# Altium schematic symbol library jlcpcb_2025_04_capacitors_extended_1210.schlib: 709 symbols (part 3 of 4) (continued)
## FV32X223K102EEG
designator C?  Capacitance: 22nF  (hidden comment: *)
Capacitor, Ceramic (MLCC), 22nF, ±10%, 1kV, X7R, ±10%, SMD 1210; Manufacturer: PSA(Prosperity Dielectrics); Manufacturer Part Number: FV32X223K102EEG; Package Size: 1210; JLCPCB Basic Part: No; JLCPCB Part Number: C692288; Supplier 1: LCSC; Category: Capacitors - MLCC; Supplier Part Number 1: C692288; Tolerance: ±10%; Voltage Rating: 1kV; Temperature Coefficient: X7R; RoHS: Yes; ComponentLink1Description: Datasheet; ComponentLink1URL: https://wmsc.lcsc.com/wmsc/upload/file/pdf/v2/lcsc/2304140030_PSA-Prosperity-Dielectrics-FV32X223K102EEG_C692288.pdf; ComponentLink2Description: JLCPCB Part URL; ComponentLink2URL: https://jlcpcb.com/partdetail/C692288; ComponentLink3Description: LCSC Part URL; ComponentLink3URL: https://lcsc.com/product-detail/Multilayer-Ceramic-Capacitors-MLCC---SMD-SMT_PSAProsperity-Dielectrics-PSAProsperity-Dielectrics-FV32X223K102EEG_C692288.html
footprint CAP-1210 (1210 (3225M) Capacitor)
pins: 1, 2

## FV32X272K202EGG
designator C?  Capacitance: 2.7nF  (hidden comment: *)
Capacitor, Ceramic (MLCC), 2.7nF, ±10%, 2kV, X7R, ±10%, SMD 1210; Manufacturer: PSA(Prosperity Dielectrics); Manufacturer Part Number: FV32X272K202EGG; Package Size: 1210; JLCPCB Basic Part: No; JLCPCB Part Number: C525360; Supplier 1: LCSC; Category: Capacitors - MLCC; Supplier Part Number 1: C525360; Tolerance: ±10%; Voltage Rating: 2kV; Temperature Coefficient: X7R; RoHS: Yes; ComponentLink1Description: Datasheet; ComponentLink1URL: https://wmsc.lcsc.com/wmsc/upload/file/pdf/v2/lcsc/2304140030_PSA-Prosperity-Dielectrics-FV32X272K202EGG_C525360.pdf; ComponentLink2Description: JLCPCB Part URL; ComponentLink2URL: https://jlcpcb.com/partdetail/C525360; ComponentLink3Description: LCSC Part URL; ComponentLink3URL: https://lcsc.com/product-detail/Multilayer-Ceramic-Capacitors-MLCC---SMD-SMT_PSAProsperity-Dielectrics-PSAProsperity-Dielectrics-FV32X272K202EGG_C525360.html
footprint CAP-1210 (1210 (3225M) Capacitor)
pins: 1, 2

## FV32X332K102ECG
designator C?  Capacitance: 3.3nF  (hidden comment: *)
Capacitor, Ceramic (MLCC), 3.3nF, 1kV, X7R, SMD 1210; Manufacturer: PSA(Prosperity Dielectrics); Manufacturer Part Number: FV32X332K102ECG; Package Size: 1210; JLCPCB Basic Part: No; JLCPCB Part Number: C2915730; Supplier 1: LCSC; Category: Capacitors - MLCC; Supplier Part Number 1: C2915730; Voltage Rating: 1kV; Temperature Coefficient: X7R; RoHS: Yes; ComponentLink1Description: Datasheet; ComponentLink1URL: https://wmsc.lcsc.com/wmsc/upload/file/pdf/v2/lcsc/2111161830_PSA-Prosperity-Dielectrics-FV32X332K102ECG_C2915730.pdf; ComponentLink2Description: JLCPCB Part URL; ComponentLink2URL: https://jlcpcb.com/partdetail/C2915730; ComponentLink3Description: LCSC Part URL; ComponentLink3URL: https://lcsc.com/product-detail/Multilayer-Ceramic-Capacitors-MLCC---SMD-SMT_PSAProsperity-Dielectrics-PSAProsperity-Dielectrics-FV32X332K102ECG_C2915730.html
footprint CAP-1210 (1210 (3225M) Capacitor)
pins: 1, 2

## FV32X332K202EGG
designator C?  Capacitance: 3.3nF  (hidden comment: *)
Capacitor, Ceramic (MLCC), 3.3nF, ±10%, 2kV, X7R, ±10%, SMD 1210; Manufacturer: PSA(Prosperity Dielectrics); Manufacturer Part Number: FV32X332K202EGG; Package Size: 1210; JLCPCB Basic Part: No; JLCPCB Part Number: C146198; Supplier 1: LCSC; Category: Capacitors - MLCC; Supplier Part Number 1: C146198; Tolerance: ±10%; Voltage Rating: 2kV; Temperature Coefficient: X7R; RoHS: Yes; ComponentLink1Description: Datasheet; ComponentLink1URL: https://wmsc.lcsc.com/wmsc/upload/file/pdf/v2/lcsc/2304140030_PSA-Prosperity-Dielectrics-FV32X332K202EGG_C146198.pdf; ComponentLink2Description: JLCPCB Part URL; ComponentLink2URL: https://jlcpcb.com/partdetail/C146198; ComponentLink3Description: LCSC Part URL; ComponentLink3URL: https://lcsc.com/product-detail/Multilayer-Ceramic-Capacitors-MLCC---SMD-SMT_PSAProsperity-Dielectrics-PSAProsperity-Dielectrics-FV32X332K202EGG_C146198.html
footprint CAP-1210 (1210 (3225M) Capacitor)
pins: 1, 2

## FV32X333K102EEG
designator C?  Capacitance: 33nF  (hidden comment: *)
Capacitor, Ceramic (MLCC), 33nF, ±10%, 1kV, ±10%, SMD 1210; Manufacturer: PSA(Prosperity Dielectrics); Manufacturer Part Number: FV32X333K102EEG; Package Size: 1210; JLCPCB Basic Part: No; JLCPCB Part Number: C1021549; Supplier 1: LCSC; Category: Capacitors - MLCC; Supplier Part Number 1: C1021549; Tolerance: ±10%; Voltage Rating: 1kV; RoHS: Yes; ComponentLink1Description: Datasheet; ComponentLink1URL: https://wmsc.lcsc.com/wmsc/upload/file/pdf/v2/lcsc/2304140030_PSA-Prosperity-Dielectrics-FV32X333K102EEG_C1021549.pdf; ComponentLink2Description: JLCPCB Part URL; ComponentLink2URL: https://jlcpcb.com/partdetail/C1021549; ComponentLink3Description: LCSC Part URL; ComponentLink3URL: https://lcsc.com/product-detail/Multilayer-Ceramic-Capacitors-MLCC---SMD-SMT_PSAProsperity-Dielectrics-PSAProsperity-Dielectrics-FV32X333K102EEG_C1021549.html
footprint CAP-1210 (1210 (3225M) Capacitor)
pins: 1, 2

## FV32X334K251EFG
designator C?  Capacitance: 330nF  (hidden comment: *)
Capacitor, Ceramic (MLCC), 330nF, ±10%, 250V, X7R, ±10%, SMD 1210; Manufacturer: PSA(Prosperity Dielectrics); Manufacturer Part Number: FV32X334K251EFG; Package Size: 1210; JLCPCB Basic Part: No; JLCPCB Part Number: C5366113; Supplier 1: LCSC; Category: Capacitors - MLCC; Supplier Part Number 1: C5366113; Tolerance: ±10%; Voltage Rating: 250V; Temperature Coefficient: X7R; RoHS: Yes; ComponentLink1Description: Datasheet; ComponentLink1URL: https://wmsc.lcsc.com/wmsc/upload/file/pdf/v2/lcsc/2302241830_PSA-Prosperity-Dielectrics-FV32X334K251EFG_C5366113.pdf; ComponentLink2Description: JLCPCB Part URL; ComponentLink2URL: https://jlcpcb.com/partdetail/C5366113; ComponentLink3Description: LCSC Part URL; ComponentLink3URL: https://lcsc.com/product-detail/Multilayer-Ceramic-Capacitors-MLCC---SMD-SMT_PSAProsperity-Dielectrics-PSAProsperity-Dielectrics-FV32X334K251EFG_C5366113.html
footprint CAP-1210 (1210 (3225M) Capacitor)
pins: 1, 2

## FV32X471K202EEG
designator C?  Capacitance: 470pF  (hidden comment: *)
Capacitor, Ceramic (MLCC), 470pF, ±10%, 2kV, X7R, ±10%, SMD 1210; Manufacturer: PSA(Prosperity Dielectrics); Manufacturer Part Number: FV32X471K202EEG; Package Size: 1210; JLCPCB Basic Part: No; JLCPCB Part Number: C146199; Supplier 1: LCSC; Category: Capacitors - MLCC; Supplier Part Number 1: C146199; Tolerance: ±10%; Voltage Rating: 2kV; Temperature Coefficient: X7R; RoHS: Yes; ComponentLink1Description: Datasheet; ComponentLink1URL: https://wmsc.lcsc.com/wmsc/upload/file/pdf/v2/lcsc/2304140030_PSA-Prosperity-Dielectrics-FV32X471K202EEG_C146199.pdf; ComponentLink2Description: JLCPCB Part URL; ComponentLink2URL: https://jlcpcb.com/partdetail/C146199; ComponentLink3Description: LCSC Part URL; ComponentLink3URL: https://lcsc.com/product-detail/Multilayer-Ceramic-Capacitors-MLCC---SMD-SMT_PSAProsperity-Dielectrics-PSAProsperity-Dielectrics-FV32X471K202EEG_C146199.html
footprint CAP-1210 (1210 (3225M) Capacitor)
pins: 1, 2

## FV32X472K202EGG
designator C?  Capacitance: 4.7nF  (hidden comment: *)
Capacitor, Ceramic (MLCC), 4.7nF, ±10%, 2kV, X7R, ±10%, SMD 1210; Manufacturer: PSA(Prosperity Dielectrics); Manufacturer Part Number: FV32X472K202EGG; Package Size: 1210; JLCPCB Basic Part: No; JLCPCB Part Number: C382199; Supplier 1: LCSC; Category: Capacitors - MLCC; Supplier Part Number 1: C382199; Tolerance: ±10%; Voltage Rating: 2kV; Temperature Coefficient: X7R; RoHS: Yes; ComponentLink1Description: Datasheet; ComponentLink1URL: https://wmsc.lcsc.com/wmsc/upload/file/pdf/v2/lcsc/2304140030_PSA-Prosperity-Dielectrics-FV32X472K202EGG_C382199.pdf; ComponentLink2Description: JLCPCB Part URL; ComponentLink2URL: https://jlcpcb.com/partdetail/C382199; ComponentLink3Description: LCSC Part URL; ComponentLink3URL: https://lcsc.com/product-detail/Multilayer-Ceramic-Capacitors-MLCC---SMD-SMT_PSAProsperity-Dielectrics-PSAProsperity-Dielectrics-FV32X472K202EGG_C382199.html
footprint CAP-1210 (1210 (3225M) Capacitor)
pins: 1, 2

## FV32X473K102EGG
designator C?  Capacitance: 47nF  (hidden comment: *)
Capacitor, Ceramic (MLCC), 47nF, ±10%, 1kV, X7R, ±10%, SMD 1210; Manufacturer: PSA(Prosperity Dielectrics); Manufacturer Part Number: FV32X473K102EGG; Package Size: 1210; JLCPCB Basic Part: No; JLCPCB Part Number: C525361; Supplier 1: LCSC; Category: Capacitors - MLCC; Supplier Part Number 1: C525361; Tolerance: ±10%; Voltage Rating: 1kV; Temperature Coefficient: X7R; RoHS: Yes; ComponentLink1Description: Datasheet; ComponentLink1URL: https://wmsc.lcsc.com/wmsc/upload/file/pdf/v2/lcsc/2304140030_PSA-Prosperity-Dielectrics-FV32X473K102EGG_C525361.pdf; ComponentLink2Description: JLCPCB Part URL; ComponentLink2URL: https://jlcpcb.com/partdetail/C525361; ComponentLink3Description: LCSC Part URL; ComponentLink3URL: https://lcsc.com/product-detail/Multilayer-Ceramic-Capacitors-MLCC---SMD-SMT_PSAProsperity-Dielectrics-PSAProsperity-Dielectrics-FV32X473K102EGG_C525361.html
footprint CAP-1210 (1210 (3225M) Capacitor)
pins: 1, 2

## GCJ32DC72A475KE01L
designator C?  Capacitance: 4.7uF  (hidden comment: *)
Capacitor, Ceramic (MLCC), 4.7uF, ±10%, 100V, X7S, ±10%, SMD 1210; Manufacturer: Murata Electronics; Manufacturer Part Number: GCJ32DC72A475KE01L; Package Size: 1210; JLCPCB Basic Part: No; JLCPCB Part Number: C437430; Supplier 1: LCSC; Category: Capacitors - MLCC; Supplier Part Number 1: C437430; Tolerance: ±10%; Voltage Rating: 100V; Temperature Coefficient: X7S; RoHS: Yes; ComponentLink1Description: Datasheet; ComponentLink1URL: https://wmsc.lcsc.com/wmsc/upload/file/pdf/v2/lcsc/2304140030_Murata-Electronics-GCJ32DC72A475KE01L_C437430.pdf; ComponentLink2Description: JLCPCB Part URL; ComponentLink2URL: https://jlcpcb.com/partdetail/C437430; ComponentLink3Description: LCSC Part URL; ComponentLink3URL: https://lcsc.com/product-detail/Multilayer-Ceramic-Capacitors-MLCC---SMD-SMT_Murata-Electronics-Murata-Electronics-GCJ32DC72A475KE01L_C437430.html
footprint CAP-1210 (1210 (3225M) Capacitor)
pins: 1, 2

## GCJ32DR72A225KA01L
designator C?  Capacitance: 2.2uF  (hidden comment: *)
Capacitor, Ceramic (MLCC), 2.2uF, ±10%, 100V, X7R, ±10%, SMD 1210; Manufacturer: Murata Electronics; Manufacturer Part Number: GCJ32DR72A225KA01L; Package Size: 1210; JLCPCB Basic Part: No; JLCPCB Part Number: C388903; Supplier 1: LCSC; Category: Capacitors - MLCC; Supplier Part Number 1: C388903; Tolerance: ±10%; Voltage Rating: 100V; Temperature Coefficient: X7R; RoHS: Yes; ComponentLink1Description: Datasheet; ComponentLink1URL: https://wmsc.lcsc.com/wmsc/upload/file/pdf/v2/lcsc/1912111437_Murata-Electronics-GCJ32DR72A225KA01L_C388903.pdf; ComponentLink2Description: JLCPCB Part URL; ComponentLink2URL: https://jlcpcb.com/partdetail/C388903; ComponentLink3Description: LCSC Part URL; ComponentLink3URL: https://lcsc.com/product-detail/Multilayer-Ceramic-Capacitors-MLCC---SMD-SMT_Murata-Electronics-Murata-Electronics-GCJ32DR72A225KA01L_C388903.html
footprint CAP-1210 (1210 (3225M) Capacitor)
pins: 1, 2

## GCJ32DR72E224KXJ1L
designator C?  Capacitance: 220nF  (hidden comment: *)
Capacitor, Ceramic (MLCC), 220nF, ±10%, 250V, X7R, ±10%, SMD 1210; Manufacturer: Murata Electronics; Manufacturer Part Number: GCJ32DR72E224KXJ1L; Package Size: 1210; JLCPCB Basic Part: No; JLCPCB Part Number: C710636; Supplier 1: LCSC; Category: Capacitors - MLCC; Supplier Part Number 1: C710636; Tolerance: ±10%; Voltage Rating: 250V; Temperature Coefficient: X7R; RoHS: Yes; ComponentLink1Description: Datasheet; ComponentLink1URL: https://wmsc.lcsc.com/wmsc/upload/file/pdf/v2/lcsc/2210190600_Murata-Electronics-GCJ32DR72E224KXJ1L_C710636.pdf; ComponentLink2Description: JLCPCB Part URL; ComponentLink2URL: https://jlcpcb.com/partdetail/C710636; ComponentLink3Description: LCSC Part URL; ComponentLink3URL: https://lcsc.com/product-detail/Multilayer-Ceramic-Capacitors-MLCC---SMD-SMT_Murata-Electronics-Murata-Electronics-GCJ32DR72E224KXJ1L_C710636.html
footprint CAP-1210 (1210 (3225M) Capacitor)
pins: 1, 2

## GCJ32EC71E226KE02L
designator C?  Capacitance: 22uF  (hidden comment: *)
Capacitor, Ceramic (MLCC), 22uF, ±10%, 25V, X7S, ±10%, SMD 1210; Manufacturer: Murata Electronics; Manufacturer Part Number: GCJ32EC71E226KE02L; Package Size: 1210; JLCPCB Basic Part: No; JLCPCB Part Number: C2987944; Supplier 1: LCSC; Category: Capacitors - MLCC; Supplier Part Number 1: C2987944; Tolerance: ±10%; Voltage Rating: 25V; Temperature Coefficient: X7S; RoHS: Yes; ComponentLink1Description: Datasheet; ComponentLink1URL: https://wmsc.lcsc.com/wmsc/upload/file/pdf/v2/lcsc/2206021745_Murata-Electronics-GCJ32EC71E226KE02L_C2987944.pdf; ComponentLink2Description: JLCPCB Part URL; ComponentLink2URL: https://jlcpcb.com/partdetail/C2987944; ComponentLink3Description: LCSC Part URL; ComponentLink3URL: https://lcsc.com/product-detail/Multilayer-Ceramic-Capacitors-MLCC---SMD-SMT_Murata-Electronics-Murata-Electronics-GCJ32EC71E226KE02L_C2987944.html
footprint CAP-1210 (1210 (3225M) Capacitor)
pins: 1, 2

## GCJ32EC71H106KA01L
designator C?  Capacitance: 10uF  (hidden comment: *)
Capacitor, Ceramic (MLCC), 10uF, ±10%, 50V, X7S, ±10%, SMD 1210; Manufacturer: Murata Electronics; Manufacturer Part Number: GCJ32EC71H106KA01L; Package Size: 1210; JLCPCB Basic Part: No; JLCPCB Part Number: C437431; Supplier 1: LCSC; Category: Capacitors - MLCC; Supplier Part Number 1: C437431; Tolerance: ±10%; Voltage Rating: 50V; Temperature Coefficient: X7S; RoHS: Yes; ComponentLink1Description: Datasheet; ComponentLink1URL: https://wmsc.lcsc.com/wmsc/upload/file/pdf/v2/lcsc/2304140030_Murata-Electronics-GCJ32EC71H106KA01L_C437431.pdf; ComponentLink2Description: JLCPCB Part URL; ComponentLink2URL: https://jlcpcb.com/partdetail/C437431; ComponentLink3Description: LCSC Part URL; ComponentLink3URL: https://lcsc.com/product-detail/Multilayer-Ceramic-Capacitors-MLCC---SMD-SMT_Murata-Electronics-Murata-Electronics-GCJ32EC71H106KA01L_C437431.html
footprint CAP-1210 (1210 (3225M) Capacitor)
pins: 1, 2

## GCJ32EL81E475KA01L
designator C?  Capacitance: 4.7uF  (hidden comment: *)
Capacitor, Ceramic (MLCC), 4.7uF, ±10%, 25V, X8L, ±10%, SMD 1210; Manufacturer: Murata Electronics; Manufacturer Part Number: GCJ32EL81E475KA01L; Package Size: 1210; JLCPCB Basic Part: No; JLCPCB Part Number: C161125; Supplier 1: LCSC; Category: Capacitors - MLCC; Supplier Part Number 1: C161125; Tolerance: ±10%; Voltage Rating: 25V; Temperature Coefficient: X8L; RoHS: Yes; ComponentLink1Description: Datasheet; ComponentLink1URL: https://wmsc.lcsc.com/wmsc/upload/file/pdf/v2/lcsc/1810250922_Murata-Electronics-GCJ32EL81E475KA01L_C161125.pdf; ComponentLink2Description: JLCPCB Part URL; ComponentLink2URL: https://jlcpcb.com/partdetail/C161125; ComponentLink3Description: LCSC Part URL; ComponentLink3URL: https://lcsc.com/product-detail/Multilayer-Ceramic-Capacitors-MLCC---SMD-SMT_Murata-Electronics-Murata-Electronics-GCJ32EL81E475KA01L_C161125.html
footprint CAP-1210 (1210 (3225M) Capacitor)
pins: 1, 2

## GCJ32ER71C226KE01L
designator C?  Capacitance: 22uF  (hidden comment: *)
Capacitor, Ceramic (MLCC), 22uF, ±10%, 16V, X7R, ±10%, SMD 1210; Manufacturer: Murata Electronics; Manufacturer Part Number: GCJ32ER71C226KE01L; Package Size: 1210; JLCPCB Basic Part: No; JLCPCB Part Number: C417134; Supplier 1: LCSC; Category: Capacitors - MLCC; Supplier Part Number 1: C417134; Tolerance: ±10%; Voltage Rating: 16V; Temperature Coefficient: X7R; RoHS: Yes; ComponentLink1Description: Datasheet; ComponentLink1URL: https://wmsc.lcsc.com/wmsc/upload/file/pdf/v2/lcsc/2201242200_Murata-Electronics-GCJ32ER71C226KE01L_C417134.pdf; ComponentLink2Description: JLCPCB Part URL; ComponentLink2URL: https://jlcpcb.com/partdetail/C417134; ComponentLink3Description: LCSC Part URL; ComponentLink3URL: https://lcsc.com/product-detail/Multilayer-Ceramic-Capacitors-MLCC---SMD-SMT_Murata-Electronics-Murata-Electronics-GCJ32ER71C226KE01L_C417134.html
footprint CAP-1210 (1210 (3225M) Capacitor)
pins: 1, 2

## GCJ32ER71H475KA12K
designator C?  Capacitance: 4.7uF  (hidden comment: *)
Capacitor, Ceramic (MLCC), 4.7uF, ±10%, 50V, X7R, ±10%, SMD 1210; Manufacturer: Murata Electronics; Manufacturer Part Number: GCJ32ER71H475KA12K; Package Size: 1210; JLCPCB Basic Part: No; JLCPCB Part Number: C2974491; Supplier 1: LCSC; Category: Capacitors - MLCC; Supplier Part Number 1: C2974491; Tolerance: ±10%; Voltage Rating: 50V; Temperature Coefficient: X7R; RoHS: Yes; ComponentLink1Description: Datasheet; ComponentLink1URL: https://wmsc.lcsc.com/wmsc/upload/file/pdf/v2/lcsc/2202111130_Murata-Electronics-GCJ32ER71H475KA12K_C2974491.pdf; ComponentLink2Description: JLCPCB Part URL; ComponentLink2URL: https://jlcpcb.com/partdetail/C2974491; ComponentLink3Description: LCSC Part URL; ComponentLink3URL: https://lcsc.com/product-detail/Multilayer-Ceramic-Capacitors-MLCC---SMD-SMT_Murata-Electronics-Murata-Electronics-GCJ32ER71H475KA12K_C2974491.html
footprint CAP-1210 (1210 (3225M) Capacitor)
pins: 1, 2

## GCJ32ER71H475KA12L
designator C?  Capacitance: 4.7uF  (hidden comment: *)
Capacitor, Ceramic (MLCC), 4.7uF, ±10%, 50V, X7R, ±10%, SMD 1210; Manufacturer: Murata Electronics; Manufacturer Part Number: GCJ32ER71H475KA12L; Package Size: 1210; JLCPCB Basic Part: No; JLCPCB Part Number: C417122; Supplier 1: LCSC; Category: Capacitors - MLCC; Supplier Part Number 1: C417122; Tolerance: ±10%; Voltage Rating: 50V; Temperature Coefficient: X7R; RoHS: Yes; ComponentLink1Description: Datasheet; ComponentLink1URL: https://wmsc.lcsc.com/wmsc/upload/file/pdf/v2/lcsc/2007231032_Murata-Electronics-GCJ32ER71H475KA12L_C417122.pdf; ComponentLink2Description: JLCPCB Part URL; ComponentLink2URL: https://jlcpcb.com/partdetail/C417122; ComponentLink3Description: LCSC Part URL; ComponentLink3URL: https://lcsc.com/product-detail/Multilayer-Ceramic-Capacitors-MLCC---SMD-SMT_Murata-Electronics-Murata-Electronics-GCJ32ER71H475KA12L_C417122.html
footprint CAP-1210 (1210 (3225M) Capacitor)
pins: 1, 2

## GCJ32ER91C106KE01L
designator C?  Capacitance: 10uF  (hidden comment: *)
Capacitor, Ceramic (MLCC), 10uF, ±10%, 16V, X8R, ±10%, SMD 1210; Manufacturer: Murata Electronics; Manufacturer Part Number: GCJ32ER91C106KE01L; Package Size: 1210; JLCPCB Basic Part: No; JLCPCB Part Number: C3832782; Supplier 1: LCSC; Category: Capacitors - MLCC; Supplier Part Number 1: C3832782; Tolerance: ±10%; Voltage Rating: 16V; Temperature Coefficient: X8R; RoHS: Yes; ComponentLink1Description: Datasheet; ComponentLink1URL: https://wmsc.lcsc.com/wmsc/upload/file/pdf/v2/lcsc/2308111425_Murata-Electronics-GCJ32ER91C106KE01L_C3832782.pdf; ComponentLink2Description: JLCPCB Part URL; ComponentLink2URL: https://jlcpcb.com/partdetail/C3832782; ComponentLink3Description: LCSC Part URL; ComponentLink3URL: https://lcsc.com/product-detail/Multilayer-Ceramic-Capacitors-MLCC---SMD-SMT_Murata-Electronics-Murata-Electronics-GCJ32ER91C106KE01L_C3832782.html
footprint CAP-1210 (1210 (3225M) Capacitor)
pins: 1, 2

## GCM32D7U2J103JX01L
designator C?  Capacitance: 10nF  (hidden comment: *)
Capacitor, Ceramic (MLCC), 10nF, ±5%, 630V, U2J, ±5%, SMD 1210; Manufacturer: Murata Electronics; Manufacturer Part Number: GCM32D7U2J103JX01L; Package Size: 1210; JLCPCB Basic Part: No; JLCPCB Part Number: C161278; Supplier 1: LCSC; Category: Capacitors - MLCC; Supplier Part Number 1: C161278; Tolerance: ±5%; Voltage Rating: 630V; Temperature Coefficient: U2J; RoHS: Yes; ComponentLink1Description: Datasheet; ComponentLink1URL: https://wmsc.lcsc.com/wmsc/upload/file/pdf/v2/lcsc/2304140030_Murata-Electronics-GCM32D7U2J103JX01L_C161278.pdf; ComponentLink2Description: JLCPCB Part URL; ComponentLink2URL: https://jlcpcb.com/partdetail/C161278; ComponentLink3Description: LCSC Part URL; ComponentLink3URL: https://lcsc.com/product-detail/Multilayer-Ceramic-Capacitors-MLCC---SMD-SMT_Murata-Electronics-Murata-Electronics-GCM32D7U2J103JX01L_C161278.html
footprint CAP-1210 (1210 (3225M) Capacitor)
pins: 1, 2

## GCM32D7U3A222JX01L
designator C?  Capacitance: 2200pF  (hidden comment: *)
Capacitor, Ceramic (MLCC), 2200pF, ±5%, 1kV, U2J, ±5%, SMD 1210; Manufacturer: Murata Electronics; Manufacturer Part Number: GCM32D7U3A222JX01L; Package Size: 1210; JLCPCB Basic Part: No; JLCPCB Part Number: C710713; Supplier 1: LCSC; Category: Capacitors - MLCC; Supplier Part Number 1: C710713; Tolerance: ±5%; Voltage Rating: 1kV; Temperature Coefficient: U2J; RoHS: Yes; ComponentLink1Description: Datasheet; ComponentLink1URL: https://wmsc.lcsc.com/wmsc/upload/file/pdf/v2/lcsc/2308111811_Murata-Electronics-GCM32D7U3A222JX01L_C710713.pdf; ComponentLink2Description: JLCPCB Part URL; ComponentLink2URL: https://jlcpcb.com/partdetail/C710713; ComponentLink3Description: LCSC Part URL; ComponentLink3URL: https://lcsc.com/product-detail/Multilayer-Ceramic-Capacitors-MLCC---SMD-SMT_Murata-Electronics-Murata-Electronics-GCM32D7U3A222JX01L_C710713.html
footprint CAP-1210 (1210 (3225M) Capacitor)
pins: 1, 2

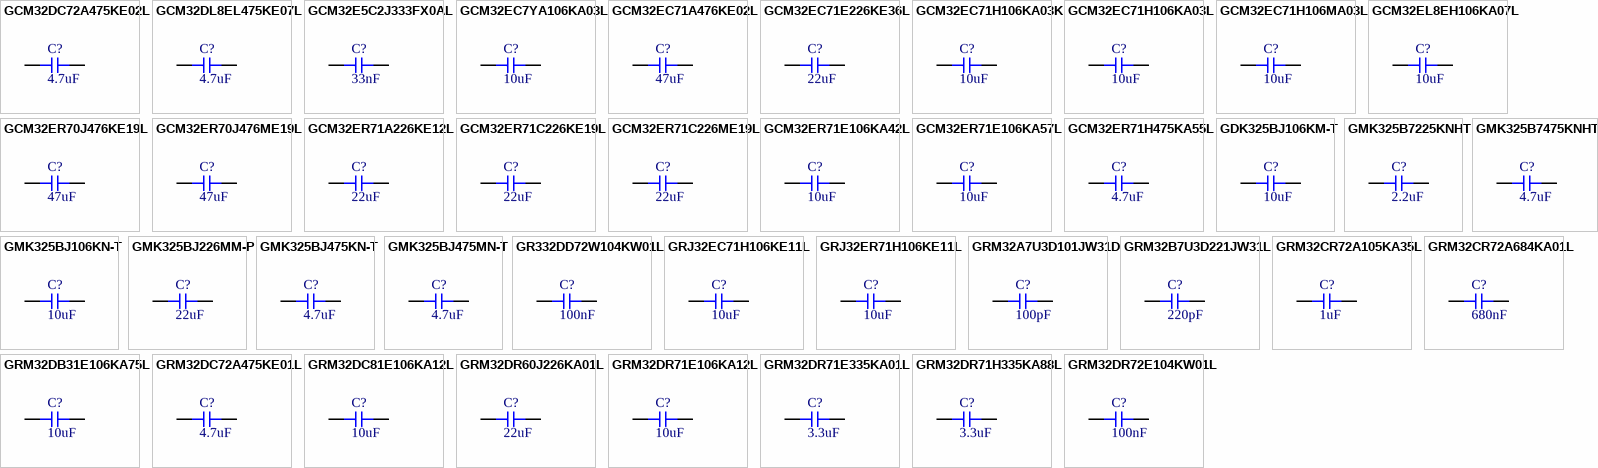
[diagram p13: symbols GCM32DC72A475KE02L to GRM32DR72E104KW01L]

## GCM32DC72A475KE02L
designator C?  Capacitance: 4.7uF  (hidden comment: *)
Capacitor, Ceramic (MLCC), 4.7uF, ±10%, 100V, ±10%, SMD 1210; Manufacturer: Murata Electronics; Manufacturer Part Number: GCM32DC72A475KE02L; Package Size: 1210; JLCPCB Basic Part: No; JLCPCB Part Number: C913445; Supplier 1: LCSC; Category: Capacitors - MLCC; Supplier Part Number 1: C913445; Tolerance: ±10%; Voltage Rating: 100V; RoHS: Yes; ComponentLink1Description: Datasheet; ComponentLink1URL: https://wmsc.lcsc.com/wmsc/upload/file/pdf/v2/lcsc/2304140030_Murata-Electronics-GCM32DC72A475KE02L_C913445.pdf; ComponentLink2Description: JLCPCB Part URL; ComponentLink2URL: https://jlcpcb.com/partdetail/C913445; ComponentLink3Description: LCSC Part URL; ComponentLink3URL: https://lcsc.com/product-detail/Multilayer-Ceramic-Capacitors-MLCC---SMD-SMT_Murata-Electronics-Murata-Electronics-GCM32DC72A475KE02L_C913445.html
footprint CAP-1210 (1210 (3225M) Capacitor)
pins: 1, 2

## GCM32DL8EL475KE07L
designator C?  Capacitance: 4.7uF  (hidden comment: *)
Capacitor, Ceramic (MLCC), 4.7uF, ±10%, 100V, ±10%, SMD 1210; Manufacturer: Murata Electronics; Manufacturer Part Number: GCM32DL8EL475KE07L; Package Size: 1210; JLCPCB Basic Part: No; JLCPCB Part Number: C883615; Supplier 1: LCSC; Category: Capacitors - MLCC; Supplier Part Number 1: C883615; Tolerance: ±10%; Voltage Rating: 100V; RoHS: Yes; ComponentLink1Description: Datasheet; ComponentLink1URL: https://wmsc.lcsc.com/wmsc/upload/file/pdf/v2/lcsc/2304140030_Murata-Electronics-GCM32DL8EL475KE07L_C883615.pdf; ComponentLink2Description: JLCPCB Part URL; ComponentLink2URL: https://jlcpcb.com/partdetail/C883615; ComponentLink3Description: LCSC Part URL; ComponentLink3URL: https://lcsc.com/product-detail/Multilayer-Ceramic-Capacitors-MLCC---SMD-SMT_Murata-Electronics-Murata-Electronics-GCM32DL8EL475KE07L_C883615.html
footprint CAP-1210 (1210 (3225M) Capacitor)
pins: 1, 2

## GCM32E5C2J333FX0AL
designator C?  Capacitance: 33nF  (hidden comment: *)
Capacitor, Ceramic (MLCC), 33nF, ±1%, 630V, C0G, ±1%, SMD 1210; Manufacturer: Murata Electronics; Manufacturer Part Number: GCM32E5C2J333FX0AL; Package Size: 1210; JLCPCB Basic Part: No; JLCPCB Part Number: C3877770; Supplier 1: LCSC; Category: Capacitors - MLCC; Supplier Part Number 1: C3877770; Tolerance: ±1%; Voltage Rating: 630V; Temperature Coefficient: C0G; RoHS: Yes; ComponentLink1Description: Datasheet; ComponentLink1URL: https://wmsc.lcsc.com/wmsc/upload/file/pdf/v2/lcsc/2308111756_Murata-Electronics-GCM32E5C2J333FX0AL_C3877770.pdf; ComponentLink2Description: JLCPCB Part URL; ComponentLink2URL: https://jlcpcb.com/partdetail/C3877770; ComponentLink3Description: LCSC Part URL; ComponentLink3URL: https://lcsc.com/product-detail/Multilayer-Ceramic-Capacitors-MLCC---SMD-SMT_Murata-Electronics-Murata-Electronics-GCM32E5C2J333FX0AL_C3877770.html
footprint CAP-1210 (1210 (3225M) Capacitor)
pins: 1, 2

## GCM32EC7YA106KA03L
designator C?  Capacitance: 10uF  (hidden comment: *)
Capacitor, Ceramic (MLCC), 10uF, ±10%, 35V, X7S, ±10%, SMD 1210; Manufacturer: Murata Electronics; Manufacturer Part Number: GCM32EC7YA106KA03L; Package Size: 1210; JLCPCB Basic Part: No; JLCPCB Part Number: C161280; Supplier 1: LCSC; Category: Capacitors - MLCC; Supplier Part Number 1: C161280; Tolerance: ±10%; Voltage Rating: 35V; Temperature Coefficient: X7S; RoHS: Yes; ComponentLink1Description: Datasheet; ComponentLink1URL: https://wmsc.lcsc.com/wmsc/upload/file/pdf/v2/lcsc/1810250922_Murata-Electronics-GCM32EC7YA106KA03L_C161280.pdf; ComponentLink2Description: JLCPCB Part URL; ComponentLink2URL: https://jlcpcb.com/partdetail/C161280; ComponentLink3Description: LCSC Part URL; ComponentLink3URL: https://lcsc.com/product-detail/Multilayer-Ceramic-Capacitors-MLCC---SMD-SMT_Murata-Electronics-Murata-Electronics-GCM32EC7YA106KA03L_C161280.html
footprint CAP-1210 (1210 (3225M) Capacitor)
pins: 1, 2

## GCM32EC71A476KE02L
designator C?  Capacitance: 47uF  (hidden comment: *)
Capacitor, Ceramic (MLCC), 47uF, ±10%, 10V, X7S, ±10%, SMD 1210; Manufacturer: Murata Electronics; Manufacturer Part Number: GCM32EC71A476KE02L; Package Size: 1210; JLCPCB Basic Part: No; JLCPCB Part Number: C3019535; Supplier 1: LCSC; Category: Capacitors - MLCC; Supplier Part Number 1: C3019535; Tolerance: ±10%; Voltage Rating: 10V; Temperature Coefficient: X7S; RoHS: Yes; ComponentLink1Description: Datasheet; ComponentLink1URL: https://wmsc.lcsc.com/wmsc/upload/file/pdf/v2/lcsc/2207261030_Murata-Electronics-GCM32EC71A476KE02L_C3019535.pdf; ComponentLink2Description: JLCPCB Part URL; ComponentLink2URL: https://jlcpcb.com/partdetail/C3019535; ComponentLink3Description: LCSC Part URL; ComponentLink3URL: https://lcsc.com/product-detail/Multilayer-Ceramic-Capacitors-MLCC---SMD-SMT_Murata-Electronics-Murata-Electronics-GCM32EC71A476KE02L_C3019535.html
footprint CAP-1210 (1210 (3225M) Capacitor)
pins: 1, 2

## GCM32EC71E226KE36L
designator C?  Capacitance: 22uF  (hidden comment: *)
Capacitor, Ceramic (MLCC), 22uF, ±10%, 25V, X7S, ±10%, SMD 1210; Manufacturer: Murata Electronics; Manufacturer Part Number: GCM32EC71E226KE36L; Package Size: 1210; JLCPCB Basic Part: No; JLCPCB Part Number: C426653; Supplier 1: LCSC; Category: Capacitors - MLCC; Supplier Part Number 1: C426653; Tolerance: ±10%; Voltage Rating: 25V; Temperature Coefficient: X7S; RoHS: Yes; ComponentLink1Description: Datasheet; ComponentLink1URL: https://wmsc.lcsc.com/wmsc/upload/file/pdf/v2/lcsc/2204021030_Murata-Electronics-GCM32EC71E226KE36L_C426653.pdf; ComponentLink2Description: JLCPCB Part URL; ComponentLink2URL: https://jlcpcb.com/partdetail/C426653; ComponentLink3Description: LCSC Part URL; ComponentLink3URL: https://lcsc.com/product-detail/Multilayer-Ceramic-Capacitors-MLCC---SMD-SMT_Murata-Electronics-Murata-Electronics-GCM32EC71E226KE36L_C426653.html
footprint CAP-1210 (1210 (3225M) Capacitor)
pins: 1, 2

## GCM32EC71H106KA03K
designator C?  Capacitance: 10uF  (hidden comment: *)
Capacitor, Ceramic (MLCC), 10uF, ±10%, 50V, X7S, ±10%, SMD 1210; Manufacturer: Murata Electronics; Manufacturer Part Number: GCM32EC71H106KA03K; Package Size: 1210; JLCPCB Basic Part: No; JLCPCB Part Number: C2180054; Supplier 1: LCSC; Category: Capacitors - MLCC; Supplier Part Number 1: C2180054; Tolerance: ±10%; Voltage Rating: 50V; Temperature Coefficient: X7S; RoHS: Yes; ComponentLink1Description: Datasheet; ComponentLink1URL: https://wmsc.lcsc.com/wmsc/upload/file/pdf/v2/lcsc/2202041100_Murata-Electronics-GCM32EC71H106KA03K_C2180054.pdf; ComponentLink2Description: JLCPCB Part URL; ComponentLink2URL: https://jlcpcb.com/partdetail/C2180054; ComponentLink3Description: LCSC Part URL; ComponentLink3URL: https://lcsc.com/product-detail/Multilayer-Ceramic-Capacitors-MLCC---SMD-SMT_Murata-Electronics-Murata-Electronics-GCM32EC71H106KA03K_C2180054.html
footprint CAP-1210 (1210 (3225M) Capacitor)
pins: 1, 2

## GCM32EC71H106KA03L
designator C?  Capacitance: 10uF  (hidden comment: *)
Capacitor, Ceramic (MLCC), 10uF, ±10%, 50V, X7S, ±10%, SMD 1210; Manufacturer: Murata Electronics; Manufacturer Part Number: GCM32EC71H106KA03L; Package Size: 1210; JLCPCB Basic Part: No; JLCPCB Part Number: C126612; Supplier 1: LCSC; Category: Capacitors - MLCC; Supplier Part Number 1: C126612; Tolerance: ±10%; Voltage Rating: 50V; Temperature Coefficient: X7S; RoHS: Yes; ComponentLink1Description: Datasheet; ComponentLink1URL: https://wmsc.lcsc.com/wmsc/upload/file/pdf/v2/lcsc/2304140030_Murata-Electronics-GCM32EC71H106KA03L_C126612.pdf; ComponentLink2Description: JLCPCB Part URL; ComponentLink2URL: https://jlcpcb.com/partdetail/C126612; ComponentLink3Description: LCSC Part URL; ComponentLink3URL: https://lcsc.com/product-detail/Multilayer-Ceramic-Capacitors-MLCC---SMD-SMT_Murata-Electronics-Murata-Electronics-GCM32EC71H106KA03L_C126612.html
footprint CAP-1210 (1210 (3225M) Capacitor)
pins: 1, 2

## GCM32EC71H106MA03L
designator C?  Capacitance: 10uF  (hidden comment: *)
Capacitor, Ceramic (MLCC), 10uF, ±20%, 50V, X7S, ±20%, SMD 1210; Manufacturer: Murata Electronics; Manufacturer Part Number: GCM32EC71H106MA03L; Package Size: 1210; JLCPCB Basic Part: No; JLCPCB Part Number: C161279; Supplier 1: LCSC; Category: Capacitors - MLCC; Supplier Part Number 1: C161279; Tolerance: ±20%; Voltage Rating: 50V; Temperature Coefficient: X7S; RoHS: Yes; ComponentLink1Description: Datasheet; ComponentLink1URL: https://wmsc.lcsc.com/wmsc/upload/file/pdf/v2/lcsc/1810250922_Murata-Electronics-GCM32EC71H106MA03L_C161279.pdf; ComponentLink2Description: JLCPCB Part URL; ComponentLink2URL: https://jlcpcb.com/partdetail/C161279; ComponentLink3Description: LCSC Part URL; ComponentLink3URL: https://lcsc.com/product-detail/Multilayer-Ceramic-Capacitors-MLCC---SMD-SMT_Murata-Electronics-Murata-Electronics-GCM32EC71H106MA03L_C161279.html
footprint CAP-1210 (1210 (3225M) Capacitor)
pins: 1, 2

## GCM32EL8EH106KA07L
designator C?  Capacitance: 10uF  (hidden comment: *)
Capacitor, Ceramic (MLCC), 10uF, ±10%, null, ±10%, SMD 1210; Manufacturer: Murata Electronics; Manufacturer Part Number: GCM32EL8EH106KA07L; Package Size: 1210; JLCPCB Basic Part: No; JLCPCB Part Number: C703079; Supplier 1: LCSC; Category: Capacitors - MLCC; Supplier Part Number 1: C703079; Tolerance: ±10%; Voltage Rating: null; RoHS: Yes; ComponentLink1Description: Datasheet; ComponentLink1URL: https://wmsc.lcsc.com/wmsc/upload/file/pdf/v2/lcsc/2308111611_Murata-Electronics-GCM32EL8EH106KA07L_C703079.pdf; ComponentLink2Description: JLCPCB Part URL; ComponentLink2URL: https://jlcpcb.com/partdetail/C703079; ComponentLink3Description: LCSC Part URL; ComponentLink3URL: https://lcsc.com/product-detail/Multilayer-Ceramic-Capacitors-MLCC---SMD-SMT_Murata-Electronics-Murata-Electronics-GCM32EL8EH106KA07L_C703079.html
footprint CAP-1210 (1210 (3225M) Capacitor)
pins: 1, 2

## GCM32ER70J476KE19L
designator C?  Capacitance: 47uF  (hidden comment: *)
Capacitor, Ceramic (MLCC), 47uF, ±10%, 6.3V, ±10%, SMD 1210; Manufacturer: Murata Electronics; Manufacturer Part Number: GCM32ER70J476KE19L; Package Size: 1210; JLCPCB Basic Part: No; JLCPCB Part Number: C440151; Supplier 1: LCSC; Category: Capacitors - MLCC; Supplier Part Number 1: C440151; Tolerance: ±10%; Voltage Rating: 6.3V; RoHS: Yes; ComponentLink1Description: Datasheet; ComponentLink1URL: https://wmsc.lcsc.com/wmsc/upload/file/pdf/v2/lcsc/2304140030_Murata-Electronics-GCM32ER70J476KE19L_C440151.pdf; ComponentLink2Description: JLCPCB Part URL; ComponentLink2URL: https://jlcpcb.com/partdetail/C440151; ComponentLink3Description: LCSC Part URL; ComponentLink3URL: https://lcsc.com/product-detail/Multilayer-Ceramic-Capacitors-MLCC---SMD-SMT_Murata-Electronics-Murata-Electronics-GCM32ER70J476KE19L_C440151.html
footprint CAP-1210 (1210 (3225M) Capacitor)
pins: 1, 2

## GCM32ER70J476ME19L
designator C?  Capacitance: 47uF  (hidden comment: *)
Capacitor, Ceramic (MLCC), 47uF, ±20%, 6.3V, X7R, ±20%, SMD 1210; Manufacturer: Murata Electronics; Manufacturer Part Number: GCM32ER70J476ME19L; Package Size: 1210; JLCPCB Basic Part: No; JLCPCB Part Number: C126613; Supplier 1: LCSC; Category: Capacitors - MLCC; Supplier Part Number 1: C126613; Tolerance: ±20%; Voltage Rating: 6.3V; Temperature Coefficient: X7R; RoHS: Yes; ComponentLink1Description: Datasheet; ComponentLink1URL: https://wmsc.lcsc.com/wmsc/upload/file/pdf/v2/lcsc/1810250910_Murata-Electronics-GCM32ER70J476ME19L_C126613.pdf; ComponentLink2Description: JLCPCB Part URL; ComponentLink2URL: https://jlcpcb.com/partdetail/C126613; ComponentLink3Description: LCSC Part URL; ComponentLink3URL: https://lcsc.com/product-detail/Multilayer-Ceramic-Capacitors-MLCC---SMD-SMT_Murata-Electronics-Murata-Electronics-GCM32ER70J476ME19L_C126613.html
footprint CAP-1210 (1210 (3225M) Capacitor)
pins: 1, 2

## GCM32ER71A226KE12L
designator C?  Capacitance: 22uF  (hidden comment: *)
Capacitor, Ceramic (MLCC), 22uF, ±10%, 10V, X7R, ±10%, SMD 1210; Manufacturer: Murata Electronics; Manufacturer Part Number: GCM32ER71A226KE12L; Package Size: 1210; JLCPCB Basic Part: No; JLCPCB Part Number: C913632; Supplier 1: LCSC; Category: Capacitors - MLCC; Supplier Part Number 1: C913632; Tolerance: ±10%; Voltage Rating: 10V; Temperature Coefficient: X7R; RoHS: Yes; ComponentLink1Description: Datasheet; ComponentLink1URL: https://wmsc.lcsc.com/wmsc/upload/file/pdf/v2/lcsc/2304140030_Murata-Electronics-GCM32ER71A226KE12L_C913632.pdf; ComponentLink2Description: JLCPCB Part URL; ComponentLink2URL: https://jlcpcb.com/partdetail/C913632; ComponentLink3Description: LCSC Part URL; ComponentLink3URL: https://lcsc.com/product-detail/Multilayer-Ceramic-Capacitors-MLCC---SMD-SMT_Murata-Electronics-Murata-Electronics-GCM32ER71A226KE12L_C913632.html
footprint CAP-1210 (1210 (3225M) Capacitor)
pins: 1, 2

## GCM32ER71C226KE19L
designator C?  Capacitance: 22uF  (hidden comment: *)
Capacitor, Ceramic (MLCC), 22uF, ±10%, 16V, X7R, ±10%, SMD 1210; Manufacturer: Murata Electronics; Manufacturer Part Number: GCM32ER71C226KE19L; Package Size: 1210; JLCPCB Basic Part: No; JLCPCB Part Number: C126614; Supplier 1: LCSC; Category: Capacitors - MLCC; Supplier Part Number 1: C126614; Tolerance: ±10%; Voltage Rating: 16V; Temperature Coefficient: X7R; RoHS: Yes; ComponentLink1Description: Datasheet; ComponentLink1URL: https://wmsc.lcsc.com/wmsc/upload/file/pdf/v2/lcsc/1912111437_Murata-Electronics-GCM32ER71C226KE19L_C126614.pdf; ComponentLink2Description: JLCPCB Part URL; ComponentLink2URL: https://jlcpcb.com/partdetail/C126614; ComponentLink3Description: LCSC Part URL; ComponentLink3URL: https://lcsc.com/product-detail/Multilayer-Ceramic-Capacitors-MLCC---SMD-SMT_Murata-Electronics-Murata-Electronics-GCM32ER71C226KE19L_C126614.html
footprint CAP-1210 (1210 (3225M) Capacitor)
pins: 1, 2

## GCM32ER71C226ME19L
designator C?  Capacitance: 22uF  (hidden comment: *)
Capacitor, Ceramic (MLCC), 22uF, ±20%, 16V, X7R, ±20%, SMD 1210; Manufacturer: Murata Electronics; Manufacturer Part Number: GCM32ER71C226ME19L; Package Size: 1210; JLCPCB Basic Part: No; JLCPCB Part Number: C126615; Supplier 1: LCSC; Category: Capacitors - MLCC; Supplier Part Number 1: C126615; Tolerance: ±20%; Voltage Rating: 16V; Temperature Coefficient: X7R; RoHS: Yes; ComponentLink1Description: Datasheet; ComponentLink1URL: https://wmsc.lcsc.com/wmsc/upload/file/pdf/v2/lcsc/1912111437_Murata-Electronics-GCM32ER71C226ME19L_C126615.pdf; ComponentLink2Description: JLCPCB Part URL; ComponentLink2URL: https://jlcpcb.com/partdetail/C126615; ComponentLink3Description: LCSC Part URL; ComponentLink3URL: https://lcsc.com/product-detail/Multilayer-Ceramic-Capacitors-MLCC---SMD-SMT_Murata-Electronics-Murata-Electronics-GCM32ER71C226ME19L_C126615.html
footprint CAP-1210 (1210 (3225M) Capacitor)
pins: 1, 2

## GCM32ER71E106KA42L
designator C?  Capacitance: 10uF  (hidden comment: *)
Capacitor, Ceramic (MLCC), 10uF, ±10%, 25V, X7R, ±10%, SMD 1210; Manufacturer: Murata Electronics; Manufacturer Part Number: GCM32ER71E106KA42L; Package Size: 1210; JLCPCB Basic Part: No; JLCPCB Part Number: C126616; Supplier 1: LCSC; Category: Capacitors - MLCC; Supplier Part Number 1: C126616; Tolerance: ±10%; Voltage Rating: 25V; Temperature Coefficient: X7R; RoHS: Yes; ComponentLink1Description: Datasheet; ComponentLink1URL: https://wmsc.lcsc.com/wmsc/upload/file/pdf/v2/lcsc/2001071613_Murata-Electronics-GCM32ER71E106KA42L_C126616.pdf; ComponentLink2Description: JLCPCB Part URL; ComponentLink2URL: https://jlcpcb.com/partdetail/C126616; ComponentLink3Description: LCSC Part URL; ComponentLink3URL: https://lcsc.com/product-detail/Multilayer-Ceramic-Capacitors-MLCC---SMD-SMT_Murata-Electronics-Murata-Electronics-GCM32ER71E106KA42L_C126616.html
footprint CAP-1210 (1210 (3225M) Capacitor)
pins: 1, 2

## GCM32ER71E106KA57L
designator C?  Capacitance: 10uF  (hidden comment: *)
Capacitor, Ceramic (MLCC), 10uF, ±10%, 25V, X7R, ±10%, SMD 1210; Manufacturer: Murata Electronics; Manufacturer Part Number: GCM32ER71E106KA57L; Package Size: 1210; JLCPCB Basic Part: No; JLCPCB Part Number: C126617; Supplier 1: LCSC; Category: Capacitors - MLCC; Supplier Part Number 1: C126617; Tolerance: ±10%; Voltage Rating: 25V; Temperature Coefficient: X7R; RoHS: Yes; ComponentLink1Description: Datasheet; ComponentLink1URL: https://wmsc.lcsc.com/wmsc/upload/file/pdf/v2/lcsc/1811021131_Murata-Electronics-GCM32ER71E106KA57L_C126617.pdf; ComponentLink2Description: JLCPCB Part URL; ComponentLink2URL: https://jlcpcb.com/partdetail/C126617; ComponentLink3Description: LCSC Part URL; ComponentLink3URL: https://lcsc.com/product-detail/Multilayer-Ceramic-Capacitors-MLCC---SMD-SMT_Murata-Electronics-Murata-Electronics-GCM32ER71E106KA57L_C126617.html
footprint CAP-1210 (1210 (3225M) Capacitor)
pins: 1, 2

## GCM32ER71H475KA55L
designator C?  Capacitance: 4.7uF  (hidden comment: *)
Capacitor, Ceramic (MLCC), 4.7uF, ±10%, 50V, X7R, ±10%, SMD 1210; Manufacturer: Murata Electronics; Manufacturer Part Number: GCM32ER71H475KA55L; Package Size: 1210; JLCPCB Basic Part: No; JLCPCB Part Number: C126618; Supplier 1: LCSC; Category: Capacitors - MLCC; Supplier Part Number 1: C126618; Tolerance: ±10%; Voltage Rating: 50V; Temperature Coefficient: X7R; RoHS: Yes; ComponentLink1Description: Datasheet; ComponentLink1URL: https://wmsc.lcsc.com/wmsc/upload/file/pdf/v2/lcsc/1912111437_Murata-Electronics-GCM32ER71H475KA55L_C126618.pdf; ComponentLink2Description: JLCPCB Part URL; ComponentLink2URL: https://jlcpcb.com/partdetail/C126618; ComponentLink3Description: LCSC Part URL; ComponentLink3URL: https://lcsc.com/product-detail/Multilayer-Ceramic-Capacitors-MLCC---SMD-SMT_Murata-Electronics-Murata-Electronics-GCM32ER71H475KA55L_C126618.html
footprint CAP-1210 (1210 (3225M) Capacitor)
pins: 1, 2

## GDK325BJ106KM-T
designator C?  Capacitance: 10uF  (hidden comment: *)
Capacitor, Ceramic (MLCC), 10uF, ±10%, 35V, X5R, ±10%, SMD 1210; Manufacturer: Taiyo Yuden; Manufacturer Part Number: GDK325BJ106KM-T; Package Size: 1210; JLCPCB Basic Part: No; JLCPCB Part Number: C311690; Supplier 1: LCSC; Category: Capacitors - MLCC; Supplier Part Number 1: C311690; Tolerance: ±10%; Voltage Rating: 35V; Temperature Coefficient: X5R; RoHS: Yes; ComponentLink1Description: Datasheet; ComponentLink1URL: https://wmsc.lcsc.com/wmsc/upload/file/pdf/v2/lcsc/2010281904_Taiyo-Yuden-GDK325BJ106KM-T_C311690.pdf; ComponentLink2Description: JLCPCB Part URL; ComponentLink2URL: https://jlcpcb.com/partdetail/C311690; ComponentLink3Description: LCSC Part URL; ComponentLink3URL: https://lcsc.com/product-detail/Multilayer-Ceramic-Capacitors-MLCC---SMD-SMT_Taiyo-Yuden-Taiyo-Yuden-GDK325BJ106KM-T_C311690.html
footprint CAP-1210 (1210 (3225M) Capacitor)
pins: 1, 2

## GMK325B7225KNHT
designator C?  Capacitance: 2.2uF  (hidden comment: *)
Capacitor, Ceramic (MLCC), 2.2uF, ±10%, 35V, X7R, ±10%, SMD 1210; Manufacturer: Taiyo Yuden; Manufacturer Part Number: GMK325B7225KNHT; Package Size: 1210; JLCPCB Basic Part: No; JLCPCB Part Number: C650965; Supplier 1: LCSC; Category: Capacitors - MLCC; Supplier Part Number 1: C650965; Tolerance: ±10%; Voltage Rating: 35V; Temperature Coefficient: X7R; RoHS: Yes; ComponentLink1Description: Datasheet; ComponentLink1URL: https://wmsc.lcsc.com/wmsc/upload/file/pdf/v2/lcsc/2304140030_Taiyo-Yuden-GMK325B7225KNHT_C650965.pdf; ComponentLink2Description: JLCPCB Part URL; ComponentLink2URL: https://jlcpcb.com/partdetail/C650965; ComponentLink3Description: LCSC Part URL; ComponentLink3URL: https://lcsc.com/product-detail/Multilayer-Ceramic-Capacitors-MLCC---SMD-SMT_Taiyo-Yuden-Taiyo-Yuden-GMK325B7225KNHT_C650965.html
footprint CAP-1210 (1210 (3225M) Capacitor)
pins: 1, 2

## GMK325B7475KNHTR
designator C?  Capacitance: 4.7uF  (hidden comment: *)
Capacitor, Ceramic (MLCC), 4.7uF, ±10%, 35V, X7R, ±10%, SMD 1210; Manufacturer: Taiyo Yuden; Manufacturer Part Number: GMK325B7475KNHTR; Package Size: 1210; JLCPCB Basic Part: No; JLCPCB Part Number: C650971; Supplier 1: LCSC; Category: Capacitors - MLCC; Supplier Part Number 1: C650971; Tolerance: ±10%; Voltage Rating: 35V; Temperature Coefficient: X7R; RoHS: Yes; ComponentLink1Description: Datasheet; ComponentLink1URL: https://wmsc.lcsc.com/wmsc/upload/file/pdf/v2/lcsc/2304140030_Taiyo-Yuden-GMK325B7475KNHTR_C650971.pdf; ComponentLink2Description: JLCPCB Part URL; ComponentLink2URL: https://jlcpcb.com/partdetail/C650971; ComponentLink3Description: LCSC Part URL; ComponentLink3URL: https://lcsc.com/product-detail/Multilayer-Ceramic-Capacitors-MLCC---SMD-SMT_Taiyo-Yuden-Taiyo-Yuden-GMK325B7475KNHTR_C650971.html
footprint CAP-1210 (1210 (3225M) Capacitor)
pins: 1, 2

## GMK325BJ106KN-T
designator C?  Capacitance: 10uF  (hidden comment: *)
Capacitor, Ceramic (MLCC), 10uF, ±10%, 35V, X5R, ±10%, SMD 1210; Manufacturer: Taiyo Yuden; Manufacturer Part Number: GMK325BJ106KN-T; Package Size: 1210; JLCPCB Basic Part: No; JLCPCB Part Number: C92799; Supplier 1: LCSC; Category: Capacitors - MLCC; Supplier Part Number 1: C92799; Tolerance: ±10%; Voltage Rating: 35V; Temperature Coefficient: X5R; RoHS: Yes; ComponentLink1Description: Datasheet; ComponentLink1URL: https://wmsc.lcsc.com/wmsc/upload/file/pdf/v2/lcsc/2211282300_Taiyo-Yuden-GMK325BJ106KN-T_C92799.pdf; ComponentLink2Description: JLCPCB Part URL; ComponentLink2URL: https://jlcpcb.com/partdetail/C92799; ComponentLink3Description: LCSC Part URL; ComponentLink3URL: https://lcsc.com/product-detail/Multilayer-Ceramic-Capacitors-MLCC---SMD-SMT_Taiyo-Yuden-Taiyo-Yuden-GMK325BJ106KN-T_C92799.html
footprint CAP-1210 (1210 (3225M) Capacitor)
pins: 1, 2

## GMK325BJ226MM-P
designator C?  Capacitance: 22uF  (hidden comment: *)
Capacitor, Ceramic (MLCC), 22uF, ±20%, 35V, X5R, ±20%, SMD 1210; Manufacturer: Taiyo Yuden; Manufacturer Part Number: GMK325BJ226MM-P; Package Size: 1210; JLCPCB Basic Part: No; JLCPCB Part Number: C778721; Supplier 1: LCSC; Category: Capacitors - MLCC; Supplier Part Number 1: C778721; Tolerance: ±20%; Voltage Rating: 35V; Temperature Coefficient: X5R; RoHS: Yes; ComponentLink1Description: Datasheet; ComponentLink1URL: https://wmsc.lcsc.com/wmsc/upload/file/pdf/v2/lcsc/2010302208_Taiyo-Yuden-GMK325BJ226MM-P_C778721.pdf; ComponentLink2Description: JLCPCB Part URL; ComponentLink2URL: https://jlcpcb.com/partdetail/C778721; ComponentLink3Description: LCSC Part URL; ComponentLink3URL: https://lcsc.com/product-detail/Multilayer-Ceramic-Capacitors-MLCC---SMD-SMT_Taiyo-Yuden-Taiyo-Yuden-GMK325BJ226MM-P_C778721.html
footprint CAP-1210 (1210 (3225M) Capacitor)
pins: 1, 2

## GMK325BJ475KN-T
designator C?  Capacitance: 4.7uF  (hidden comment: *)
Capacitor, Ceramic (MLCC), 4.7uF, ±10%, 35V, X5R, ±10%, SMD 1210; Manufacturer: Taiyo Yuden; Manufacturer Part Number: GMK325BJ475KN-T; Package Size: 1210; JLCPCB Basic Part: No; JLCPCB Part Number: C555366; Supplier 1: LCSC; Category: Capacitors - MLCC; Supplier Part Number 1: C555366; Tolerance: ±10%; Voltage Rating: 35V; Temperature Coefficient: X5R; RoHS: Yes; ComponentLink1Description: Datasheet; ComponentLink1URL: https://wmsc.lcsc.com/wmsc/upload/file/pdf/v2/lcsc/2304140030_Taiyo-Yuden-GMK325BJ475KN-T_C555366.pdf; ComponentLink2Description: JLCPCB Part URL; ComponentLink2URL: https://jlcpcb.com/partdetail/C555366; ComponentLink3Description: LCSC Part URL; ComponentLink3URL: https://lcsc.com/product-detail/Multilayer-Ceramic-Capacitors-MLCC---SMD-SMT_Taiyo-Yuden-Taiyo-Yuden-GMK325BJ475KN-T_C555366.html
footprint CAP-1210 (1210 (3225M) Capacitor)
pins: 1, 2

## GMK325BJ475MN-T
designator C?  Capacitance: 4.7uF  (hidden comment: *)
Capacitor, Ceramic (MLCC), 4.7uF, ±20%, 35V, X5R, ±20%, SMD 1210; Manufacturer: Taiyo Yuden; Manufacturer Part Number: GMK325BJ475MN-T; Package Size: 1210; JLCPCB Basic Part: No; JLCPCB Part Number: C454104; Supplier 1: LCSC; Category: Capacitors - MLCC; Supplier Part Number 1: C454104; Tolerance: ±20%; Voltage Rating: 35V; Temperature Coefficient: X5R; RoHS: Yes; ComponentLink1Description: Datasheet; ComponentLink1URL: https://wmsc.lcsc.com/wmsc/upload/file/pdf/v2/lcsc/2211282230_Taiyo-Yuden-GMK325BJ475MN-T_C454104.pdf; ComponentLink2Description: JLCPCB Part URL; ComponentLink2URL: https://jlcpcb.com/partdetail/C454104; ComponentLink3Description: LCSC Part URL; ComponentLink3URL: https://lcsc.com/product-detail/Multilayer-Ceramic-Capacitors-MLCC---SMD-SMT_Taiyo-Yuden-Taiyo-Yuden-GMK325BJ475MN-T_C454104.html
footprint CAP-1210 (1210 (3225M) Capacitor)
pins: 1, 2

## GR332DD72W104KW01L
designator C?  Capacitance: 100nF  (hidden comment: *)
Capacitor, Ceramic (MLCC), 100nF, ±10%, 450V, X7T, ±10%, SMD 1210; Manufacturer: Murata Electronics; Manufacturer Part Number: GR332DD72W104KW01L; Package Size: 1210; JLCPCB Basic Part: No; JLCPCB Part Number: C161352; Supplier 1: LCSC; Category: Capacitors - MLCC; Supplier Part Number 1: C161352; Tolerance: ±10%; Voltage Rating: 450V; Temperature Coefficient: X7T; RoHS: Yes; ComponentLink1Description: Datasheet; ComponentLink1URL: https://wmsc.lcsc.com/wmsc/upload/file/pdf/v2/lcsc/1810250908_Murata-Electronics-GR332DD72W104KW01L_C161352.pdf; ComponentLink2Description: JLCPCB Part URL; ComponentLink2URL: https://jlcpcb.com/partdetail/C161352; ComponentLink3Description: LCSC Part URL; ComponentLink3URL: https://lcsc.com/product-detail/Multilayer-Ceramic-Capacitors-MLCC---SMD-SMT_Murata-Electronics-Murata-Electronics-GR332DD72W104KW01L_C161352.html
footprint CAP-1210 (1210 (3225M) Capacitor)
pins: 1, 2